# Altium footprint library klp.PcbLib: 436 footprints (part 24 of 28)
Each footprint in its own frame and in the unit in brackets; x right, y up, seen from the top. Pads: shape width x height; smd on the part's side, far side on the other; paste and mask are expansions set on the pad; w line width, h text height; cw(c..) or ccw(c..) is an arc to the next point about the centre after c.
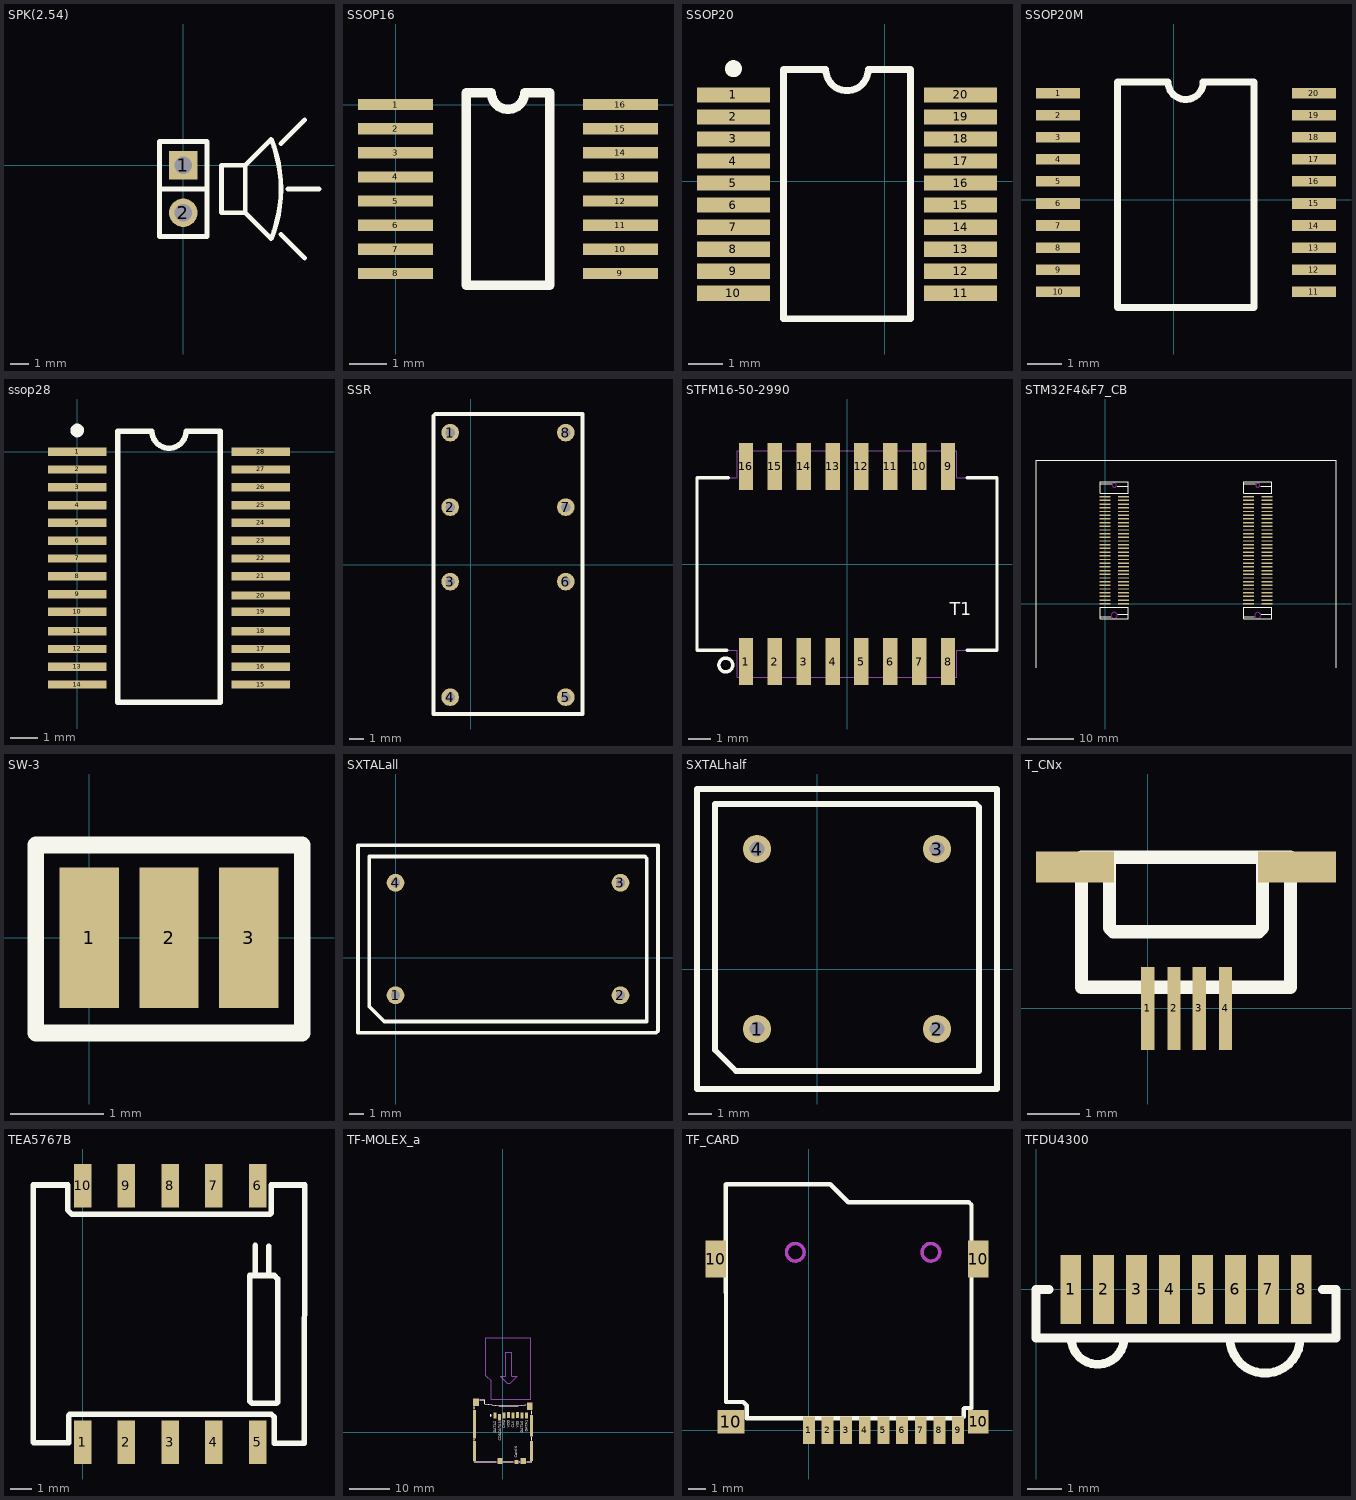
[diagram p23: the footprints below, top view; thin cyan lines are the x and y axes]

## SPK(2.54) [mil]
pads (2):
  rect 60x60 hole 36: 1(0,0)
  round 60 hole 36: 2(0,-100)
Top Overlay:
  lines w10: -50,-50 50,-50 ; 184.33,-154.72 ccw(c-70,-50) 184.33,54.72 ; 184.33,-154.33 130,-100 ; 184.33,54.33 130,0 ; 205,-145 255,-195 ; 205,45 255,95 ; 220,-50 285,-50 ; 130,-100 80,-100 80,0 130,0 ; 130,-100 130,0 ; -50,-150 -50,50 50,50 50,-150 -50,-150

## SSOP16 [mm]
pads (16):
  rect 2x0.3 smd: 1(0,0) 2(0,-0.643) 3(0,-1.286) 4(0,-1.929) 5(0,-2.572) 6(0,-3.215) 7(0,-3.858) 8(0,-4.501) 9(6,-4.501) 10(6,-3.858) 11(6,-3.215) 12(6,-2.572) 13(6,-1.929) 14(6,-1.286) 15(6,-0.643) 16(6,0)
Top Overlay:
  lines w0.254: 1.889,-4.822 4.111,-4.822 4.111,0.322 3.447,0.322 cw(c3,0.322) 2.553,0.322 1.889,0.322 1.889,-4.822

## SSOP20 [mm]
height 1
pads (20):
  rect 2.15x0.45 smd: 1(-4.468,2.544) 2(-4.468,1.894) 3(-4.468,1.244) 4(-4.468,0.594) 5(-4.468,-0.056) 6(-4.468,-0.706) 7(-4.468,-1.356) 8(-4.468,-2.006) 9(-4.468,-2.656) 10(-4.468,-3.306) 11(2.232,-3.306) 12(2.232,-2.656) 13(2.232,-2.006) 14(2.232,-1.356) 15(2.232,-0.706) 16(2.232,-0.056) 17(2.232,0.594) 18(2.232,1.244) 19(2.232,1.894) 20(2.232,2.544)
Top Overlay:
  circle w0.25: c-4.468,3.319 r0.125
  lines w0.2: -2.993,-4.056 -2.993,3.294 -1.743,3.294 ccw(c-1.118,3.294) -0.493,3.294 0.757,3.294 0.757,-4.056 -2.993,-4.056

## SSOP20M [mil] "SOP20M"
height 59.06
pads (20):
  rect 50x12 smd: 1(-131,121) 2(-131,96) 3(-131,71) 4(-131,46) 5(-131,21) 6(-131,-4) 7(-131,-29) 8(-131,-54) 9(-131,-79) 10(-131,-104) 11(159,-104) 12(159,-79) 13(159,-54) 14(159,-29) 15(159,-4) 16(159,21) 17(159,46) 18(159,71) 19(159,96) 20(159,121)
Top Overlay:
  lines w7.87: -7,133.79 -63.76,133.79 -63.76,-122.11 90.97,-122.11 90.97,133.79 33,133.79 ; -6.39,133.79 ccw(c13.61,133.79) 33.61,133.79

## ssop28 [mm] "SSOP28"
height 6.86
pads (28):
  rect 2.15x0.305 smd: 1(0,0) 2(0,-0.65) 3(0,-1.3) 4(0,-1.95) 5(0,-2.6) 6(0,-3.25) 7(0,-3.9) 8(0,-4.55) 9(0,-5.2) 10(0,-5.85) 11(0,-6.552) 12(0,-7.202) 13(0,-7.852) 14(0,-8.502) 15(6.7,-8.502) 16(6.7,-7.852) 17(6.7,-7.202) 18(6.7,-6.552) 19(6.7,-5.85) 20(6.7,-5.252) 21(6.7,-4.55) 22(6.7,-3.9) 23(6.7,-3.25) 24(6.7,-2.6) 25(6.7,-1.95) 26(6.7,-1.3) 27(6.7,-0.65) 28(6.7,0)
Top Overlay:
  circle w0.25: c0,0.775 r0.125
  lines w0.2: 1.475,-9.144 5.225,-9.144 5.225,0.75 3.975,0.75 cw(c3.35,0.75) 2.725,0.75 1.475,0.75 1.475,-9.144

## SSR [mm]
height 12
pads (8):
  round 1.2 hole 0.635: 1(-1.397,9.017) 2(-1.397,3.937) 3(-1.397,-1.143) 4(-1.397,-9.017) 5(6.477,-9.017) 6(6.477,-1.143) 7(6.477,3.937) 8(6.477,9.017)
Top Overlay:
  lines w0.254: -2.54,-10.16 7.62,-10.16 7.62,10.287 -2.413,10.287 -2.54,10.16 -2.54,-10.16

## STFM16-50-2990 [mil]
pads (16):
  rect 25x82 smd: 1(-175,-169) 2(-125,-169) 3(-75,-169) 4(-25,-169) 5(25,-169) 6(75,-169) 7(125,-169) 8(175,-169) 9(175,169) 10(125,169) 11(75,169) 12(25,169) 13(-25,169) 14(-75,169) 15(-125,169) 16(-175,169)
Top Overlay:
  circle w6: c-209.92,-174.96 r12
  lines w6: -208,-149.61 -259.84,-149.61 -259.84,149.61 -205.34,149.61 ; 208,-149.61 259.84,-149.61 259.84,149.61 208,149.61
  text "T1" at 178,-89 h22
Mechanical 16:
  lines w1: -259.84,-149.61 -190,-149.61 -190,-195.87 190,-195.87 190,-149.61 259.84,-149.61 259.84,149.61 190,149.61 190,195.87 -190,195.87 -190,149.61 -259.84,149.61 -259.84,-149.61

## STM32F4&F7_CB [mm]
pads (120):
  rect 2.3x0.3 smd: J1_1(0,0) J1_2(0,0.8) J1_3(0,1.6) J1_4(0,2.4) J1_5(0,3.2) J1_6(0,4) J1_7(0,4.8) J1_8(0,5.6) J1_9(0,6.4) J1_10(0,7.2) J1_11(0,8) J1_12(0,8.8) J1_13(0,9.6) J1_14(0,10.4) J1_15(0,11.2) J1_16(0,12) J1_17(0,12.8) J1_18(0,13.6) J1_19(0,14.4) J1_20(0,15.2) J1_21(0,16) J1_22(0,16.8) J1_23(0,17.6) J1_24(0,18.4) J1_25(0,19.2) J1_26(0,20) J1_27(0,20.8) J1_28(0,21.6) J1_29(0,22.4) J1_30(0,23.2) J1_31(4,23.2) J1_32(4,22.4) J1_33(4,21.6) J1_34(4,20.8) J1_35(4,20) J1_36(4,19.2) J1_37(4,18.4) J1_38(4,17.6) J1_39(4,16.8) J1_40(4,16) J1_41(4,15.2) J1_42(4,14.4) J1_43(4,13.6) J1_44(4,12.8) J1_45(4,12) J1_46(4,11.2) J1_47(4,10.4) J1_48(4,9.6) J1_49(4,8.8) J1_50(4,8) J1_51(4,7.2) J1_52(4,6.4) J1_53(4,5.6) J1_54(4,4.8) J1_55(4,4) J1_56(4,3.2) J1_57(4,2.4) J1_58(4,1.6) J1_59(4,0.8) J1_60(4,0) J2_1(31.1,0.001) J2_2(31.1,0.801) J2_3(31.1,1.601) J2_4(31.1,2.401) J2_5(31.1,3.201) J2_6(31.1,4.001) J2_7(31.1,4.801) J2_8(31.1,5.601) J2_9(31.1,6.401) J2_10(31.1,7.201) J2_11(31.1,8.001) J2_12(31.1,8.801) J2_13(31.1,9.601) J2_14(31.1,10.401) J2_15(31.1,11.201) J2_16(31.1,12.001) J2_17(31.1,12.801) J2_18(31.1,13.601) J2_19(31.1,14.401) J2_20(31.1,15.201) J2_21(31.1,16.001) J2_22(31.1,16.801) J2_23(31.1,17.601) J2_24(31.1,18.401) J2_25(31.1,19.201) J2_26(31.1,20.001) J2_27(31.1,20.801) J2_28(31.1,21.601) J2_29(31.1,22.401) J2_30(31.1,23.201) J2_31(35.1,23.201) J2_32(35.1,22.401) J2_33(35.1,21.601) J2_34(35.1,20.801) J2_35(35.1,20.001) J2_36(35.1,19.201) J2_37(35.1,18.401) J2_38(35.1,17.601) J2_39(35.1,16.801) J2_40(35.1,16.001) J2_41(35.1,15.201) J2_42(35.1,14.401) J2_43(35.1,13.601) J2_44(35.1,12.801) J2_45(35.1,12.001) J2_46(35.1,11.201) J2_47(35.1,10.401) J2_48(35.1,9.601) J2_49(35.1,8.801) J2_50(35.1,8.001) J2_51(35.1,7.201) J2_52(35.1,6.401) J2_53(35.1,5.601) J2_54(35.1,4.801) J2_55(35.1,4.001) J2_56(35.1,3.201) J2_57(35.1,2.401) J2_58(35.1,1.601) J2_59(35.1,0.801) J2_60(35.1,0.001)
Top Overlay:
  lines w0.152: -14.95,-13.874 -14.95,31.126 50.05,31.126 50.05,-13.874 ; -1,-2.8 1.2,-2.8 ; -1,-0.775 -1,-3.275 5,-3.275 5,-0.775 -0.975,-0.775 ; -1,26 1.5,26 ; 2.6,25.5 5,25.5 ; 2.8,-2.3 5,-2.3 ; 30.1,-2.799 32.3,-2.799 ; 30.1,-0.774 30.1,-3.274 36.1,-3.274 36.1,-0.774 30.125,-0.774 ; 30.1,26.001 32.6,26.001 ; 33.7,25.501 36.1,25.501 ; 33.9,-2.299 36.1,-2.299 ; -1,23.975 -1,26.475 5,26.475 5,23.975 -1,23.975 ; 30.1,23.976 36.1,23.976 36.1,26.476 30.1,26.476 30.1,23.976
Keep-Out Layer:
  circle w0.152: c33.1,25.701 r0.45
  circle w0.152: c33.1,-2.499 r0.65
  circle w0.152: c2,-2.5 r0.65
  circle w0.152: c2,25.7 r0.45

## SW-3 [mm]
pads (3):
  rect 0.635x1.5 smd: 1(0,0) 2(0.851,0) 3(1.702,0)
Top Overlay:
  lines w0.178: -0.572,-1.016 2.273,-1.016 2.273,0.991 -0.572,0.991 -0.572,-1.016

## SXTALall [mm] "SXTAL"
height 5
pads (4):
  round 1.2 hole 0.635: 1(0,-2.54) 2(15.24,-2.54) 3(15.24,5.08) 4(0,5.08)
Top Overlay:
  lines w0.254: -2.54,-5.08 -2.54,7.62 17.78,7.62 17.78,-4.953 17.653,-5.08 -2.54,-5.08 ; -1.778,-3.302 -1.778,6.858 16.891,6.858 17.018,6.731 17.018,-4.318 -0.762,-4.318 -1.778,-3.302

## SXTALhalf [mm] "SXTAL"
height 5
pads (4):
  round 1.2 hole 0.635: 1(-2.54,-2.54) 2(5.08,-2.54) 3(5.08,5.08) 4(-2.54,5.08)
Top Overlay:
  lines w0.254: -5.08,-5.08 -5.08,7.62 0,7.62 7.62,7.62 7.62,-5.08 -5.08,-5.08 ; -4.318,-3.429 -4.318,6.985 6.731,6.985 6.858,6.858 6.858,-4.318 -3.429,-4.318 -4.318,-3.429

## T_CNx [mil] "TOUCH_CN"
height 39.37
pads (6):
  rect 10x62.99 smd: 1(0,0) 2(20,0) 3(39,0) 4(59,0)
  rect 59.06x23.62 smd: ""(-55,107) ""(113,107)
Top Overlay:
  lines w10: -29,114.43 -29,61 -26,58 84,58 87,61 87,114.43 ; 107.48,16 -50,16 -50,114.43 108,114.43 108,16

## TEA5767B [mm] "TEA5767"
height 2
pads (10):
  rect 0.8x2 smd: 1(0,5.08) 2(2,5.08) 3(4,5.08) 4(6,5.08) 5(8,5.08) 6(8,16.8) 7(6,16.8) 8(4,16.8) 9(2,16.8) 10(0,16.8)
Top Overlay:
  lines w0.254: 7.899,12.7 7.899,14.072 ; 8.509,12.7 8.509,14.046 ; -2.261,5.08 -2.261,16.84 -0.686,16.84 -0.686,15.697 -0.483,15.494 8.56,15.494 8.636,15.57 8.636,16.84 10.16,16.84 10.16,16.637 10.135,5.029 8.763,5.029 8.763,6.223 8.636,6.35 -0.584,6.35 -0.635,6.299 -0.635,5.055 -2.235,5.055 -2.261,5.08 ; 7.645,6.96 7.645,12.7 8.763,12.7 8.915,12.548 8.915,6.909 8.865,6.858 7.747,6.858 7.645,6.96

## TF-MOLEX_a [mm]
pads (17):
  rect 0.7x1.5 smd: 1(-1.94,4.024) 2(-0.84,3.624) 3(0.26,4.024) 4(1.36,4.224) 5(2.46,4.024) 6(3.56,4.224) 7(4.66,4.024) 8(5.76,4.024)
  rect 0.95x1 smd: 9(3.312,-7.314)
  rect 1.3x1.4 smd: 10(4.95,-7.09) 17(-0.75,-7.09)
  rect 0.711x4.877 smd: 11(7,-4.623)
  rect 0.711x5.3 smd: 12(7,1.575)
  rect 1.4x1.9 smd: 13(6.55,6.314) 14(-6.6,7.314)
  rect 0.711x7 smd: 15(-7,1.956)
  rect 0.711x4.9 smd: 16(-7,-4.623)
Top Overlay:
  circle w0.254: c-3.023,4.064 r0.127
  lines w0.203: -7,-7.236 -1.625,-7.236 ; -7,-1.956 -7,-1.753 ; -7,5.664 -7,6.147 ; -5.638,7.964 -4.5,7.964 -4.5,6.964 ccw(c1.25,36.022) 5.565,6.717 ; 0.127,-7.236 2.575,-7.236 ; 3.998,-7.236 4.074,-7.236 ; 5.817,-7.236 7,-7.236 ; 7,-1.981 7,-1.295 ; 7,4.445 7,5.156
  text "DATA1" at 6.071,0.12 h0.64
  text "DATA0" at 4.979,-0.152 h0.64
  text "VSS" at 3.836,1.045 h0.64
  text "CLK" at 2.769,1.111 h0.64
  text "CMD" at 0.585,0.878 h0.64
  text "CD&DATA3" at -0.482,-2.081 h0.64
  text "DATA2" at -1.651,-0.152 h0.64
  text "VDD" at 1.677,1.045 h0.64
  text "Card N" at 3.541,-6.248 h0.64
Mechanical 15:
  lines w0.203: -4.501,6.957 ccw(c1.212,36.022) 7,6.972 7,-7.236 -7,-7.236 -7,7.964 -4.5,7.964 -4.5,6.964 ; -4.21,13.805 -4.21,23.064 6.79,23.064 6.79,8.064 -2.91,8.064 -2.91,12.464 ; -4.21,13.809 -2.91,12.509 ; -0.675,13.652 1.002,11.976 1.764,11.976 3.465,13.678 2.17,13.678 2.17,19.57 0.621,19.57 0.621,13.652 -0.675,13.652

## TF_CARD [mm]
pads (13):
  rect 0.7x1.6 smd: 1(0,0) 2(1.1,0) 3(2.2,0) 4(3.3,0) 5(4.4,0) 6(5.5,0) 7(6.6,0) 8(7.7,0) 9(8.8,0)
  rect 1.2x2.2 smd: 10(-5.5,10.1) 10(10,10.1)
  rect 1.6x1.4 smd: 10(-4.6,0.5)
  rect 1.2x1.4 smd: 10(10,0.5)
Top Overlay:
  lines w0.254: -4.9,14.5 -4.884,1.667 -3.868,1.667 -3.665,1.464 -3.665,0.702 9.035,0.702 9.136,0.804 9.136,1.261 9.187,1.312 9.594,1.312 ; -4.88,14.52 1.262,14.52 2.329,13.453 9.441,13.453 9.543,13.351 ; 9.594,1.313 9.594,13.302
Keep-Out Layer:
  circle w0.2: c-0.8,10.5 r0.52
  circle w0.2: c7.2,10.5 r0.52
Mechanical 1:
  circle w0.2: c-0.8,10.5 r0.52
  circle w0.2: c7.2,10.5 r0.52

## TFDU4300 [mm] "8.5mm*2.85mm;pin:0.95mm;"
height 2.4
pads (8):
  rect 0.6x2 smd: 1(1,0) 2(1.95,0) 3(2.9,0) 4(3.85,0) 5(4.8,0) 6(5.75,0) 7(6.7,0) 8(7.65,0)
Top Overlay:
  lines w0.254: 0.381,0 0,0 0,-1.397 8.65,-1.397 8.65,0 8.255,0 ; 1.016,-1.397 ccw(c1.778,-1.397) 2.54,-1.397 ; 5.588,-1.397 ccw(c6.604,-1.397) 7.62,-1.397